# Altium footprint library 6-Connectors-4.PcbLib: 166 footprints (part 10 of 12)
Each footprint in its own frame and in the unit in brackets; x right, y up, seen from the top. Pads: shape width x height; smd on the part's side, far side on the other; paste and mask are expansions set on the pad; w line width, h text height; cw(c..) or ccw(c..) is an arc to the next point about the centre after c.
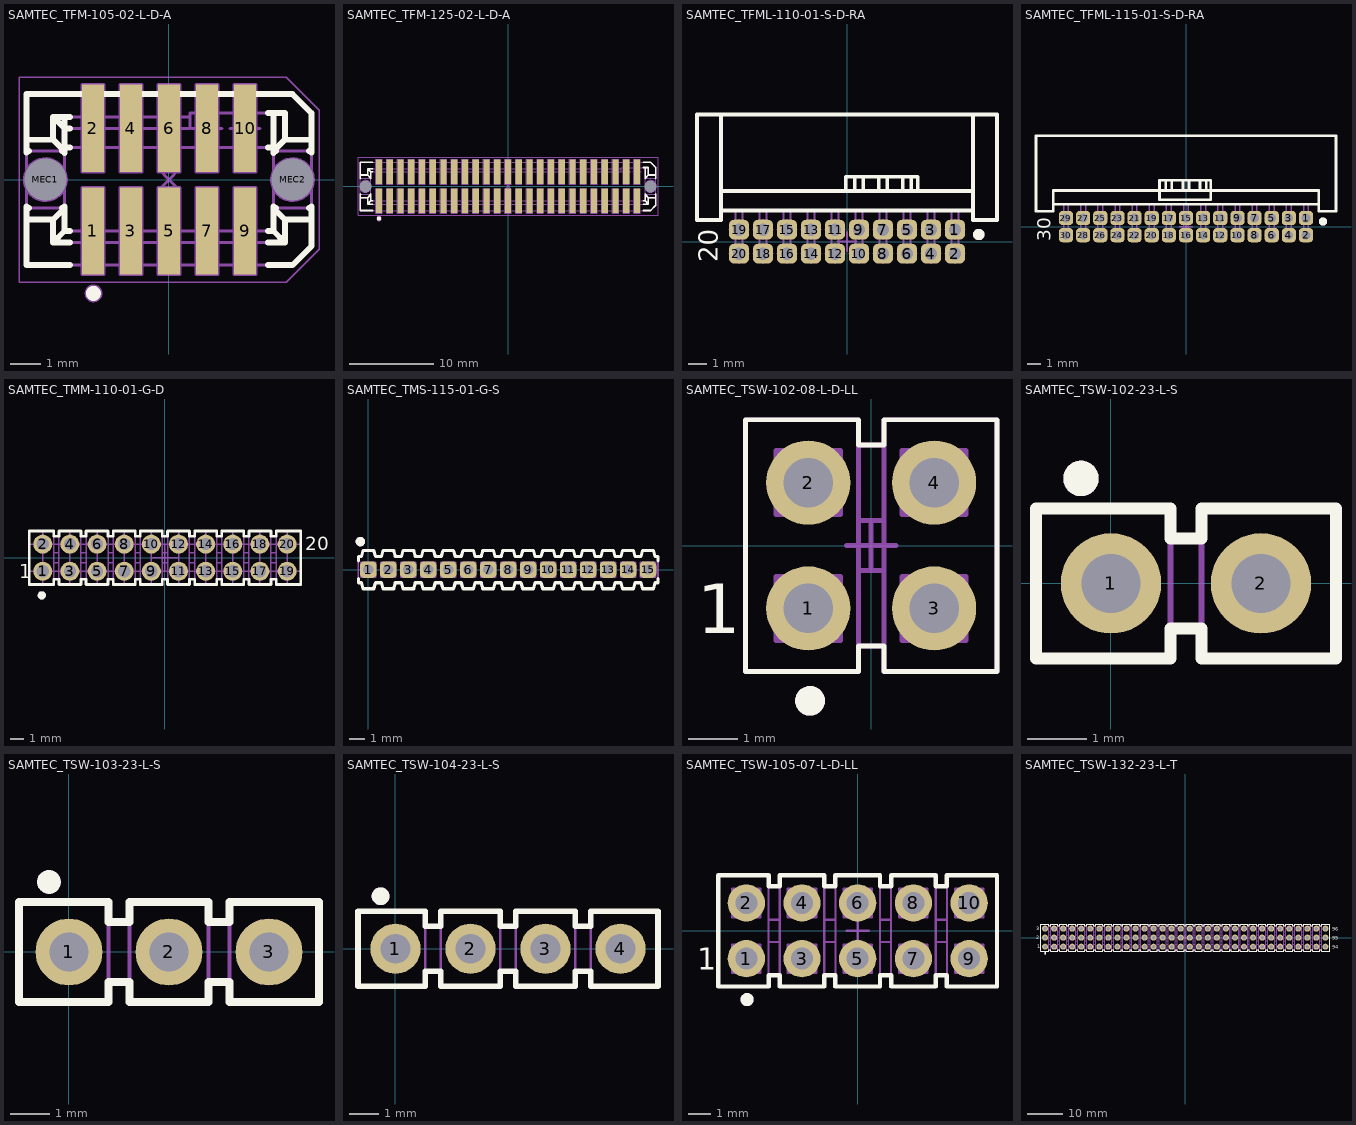
[diagram p9: the footprints below, top view; thin cyan lines are the x and y axes]

## SAMTEC_TFM-105-02-L-D-A [mm] "10 Contacts - Pitch 1.27mm - Dual Row Straight SMT Header"
height 5.72
pads (12):
  rect 0.74x2.92 smd: 1(-2.54,-1.715) 2(-2.54,1.715) 3(-1.27,-1.715) 4(-1.27,1.715) 5(0,-1.715) 6(0,1.715) 7(1.27,-1.715) 8(1.27,1.715) 9(2.54,-1.715) 10(2.54,1.715)
  round 1 hole 1.4 unplated mask+0.2: MEC1(-4.13,0) MEC2(4.13,0)
Top Overlay:
  circle w0.25: c-2.525,-3.8 r0.125
  circle w0.25: c-2.525,-3.8 r0.125
  lines w0.2: -4.762,-1.333 -3.873,-1.333 ; -4.762,-0.953 -4.68,-0.953 ; -4.762,-0.9 -4.762,-2.858 -3.31,-2.858 ; -4.762,0.9 -4.762,2.858 4.128,2.858 4.763,2.222 4.763,0.9 ; -4.762,0.953 -4.68,0.953 ; -4.762,1.333 -3.873,1.333 ; -3.58,-0.953 -3.492,-0.953 -3.873,-1.333 ; -3.58,0.953 -3.492,0.953 -3.873,1.333 ; -3.492,-0.896 -3.492,-1.714 ; -3.492,0.896 -3.492,2.095 ; -3.492,1.079 -3.31,1.079 ; -3.31,-2.095 -3.873,-2.095 ; -3.31,-1.714 -3.492,-1.714 ; -3.31,1.714 -3.492,1.714 -3.873,2.095 ; -3.31,2.095 -3.873,2.095 ; 3.31,-2.858 4.128,-2.858 4.763,-2.222 4.763,-0.9 ; 3.31,-2.095 3.874,-2.095 ; 3.31,-1.714 3.493,-1.714 ; 3.31,1.079 3.493,1.079 ; 3.31,2.222 3.874,2.222 3.874,1.333 ; 3.493,-0.896 3.493,-1.714 ; 3.493,0.896 3.493,2.222 ; 3.58,-0.953 3.493,-0.953 3.874,-1.333 ; 3.58,0.953 3.493,0.953 3.874,1.333 ; 4.68,-0.953 4.763,-0.953 ; 4.68,0.953 4.763,0.953 ; 4.763,-1.333 3.874,-1.333 ; 4.763,1.333 3.874,1.333 ; -3.873,-2.095 -3.492,-1.714 ; -3.873,-2.095 -3.873,-1.333 ; -3.873,1.333 -3.873,2.095 ; 3.493,-1.714 3.874,-2.095 ; 3.874,-2.095 3.874,-1.333
Mechanical 8:
  circle w0.1: c4.13,0 r0.7
  circle w0.1: c-4.13,0 r0.7
  lines w0.1: -4.63,0 -4.13,0 ; -4.13,-0.5 -4.13,0 ; -4.13,0.5 -4.13,0 ; -3.63,0 -4.13,0 ; -3.04,-1.715 -2.54,-1.715 ; -3.04,1.715 -2.54,1.715 ; -2.54,-2.215 -2.54,-1.715 ; -2.54,-1.215 -2.54,-1.715 ; -2.54,1.215 -2.54,1.715 ; -2.54,2.215 -2.54,1.715 ; -2.04,-1.715 -2.54,-1.715 ; -2.04,1.715 -2.54,1.715 ; -1.77,-1.715 -1.27,-1.715 ; -1.77,1.715 -1.27,1.715 ; -1.27,-2.215 -1.27,-1.715 ; -1.27,-1.215 -1.27,-1.715 ; -1.27,1.215 -1.27,1.715 ; -1.27,2.215 -1.27,1.715 ; -0.77,-1.715 -1.27,-1.715 ; -0.77,1.715 -1.27,1.715 ; -0.5,-1.715 0,-1.715 ; -0.5,1.715 0,1.715 ; -0.354,-0.354 0,0 ; -0.354,0.354 0,0 ; 0,-2.215 0,-1.715 ; 0,-1.215 0,-1.715 ; 0,1.215 0,1.715 ; 0,2.215 0,1.715 ; 0.354,-0.354 0,0 ; 0.354,0.354 0,0 ; 0.5,-1.715 0,-1.715 ; 0.5,1.715 0,1.715 ; 0.77,-1.715 1.27,-1.715 ; 0.77,1.715 1.27,1.715 ; 1.27,-2.215 1.27,-1.715 ; 1.27,-1.215 1.27,-1.715 ; 1.27,1.215 1.27,1.715 ; 1.27,2.215 1.27,1.715 ; 1.77,-1.715 1.27,-1.715 ; 1.77,1.715 1.27,1.715 ; 2.04,-1.715 2.54,-1.715 ; 2.04,1.715 2.54,1.715 ; 2.54,-2.215 2.54,-1.715 ; 2.54,-1.215 2.54,-1.715 ; 2.54,1.215 2.54,1.715 ; 2.54,2.215 2.54,1.715 ; 3.04,-1.715 2.54,-1.715 ; 3.04,1.715 2.54,1.715 ; 3.63,0 4.13,0 ; 4.13,-0.5 4.13,0 ; 4.13,0.5 4.13,0 ; 4.63,0 4.13,0 ; -2.91,-3.175 -2.91,-0.255 -2.17,-0.255 -2.17,-3.175 -2.91,-3.175 ; -2.91,0.255 -2.91,3.175 -2.17,3.175 -2.17,0.255 -2.91,0.255 ; -1.64,-3.175 -1.64,-0.255 -0.9,-0.255 -0.9,-3.175 -1.64,-3.175 ; -1.64,0.255 -1.64,3.175 -0.9,3.175 -0.9,0.255 -1.64,0.255 ; -0.37,-3.175 -0.37,-0.255 0.37,-0.255 0.37,-3.175 -0.37,-3.175 ; -0.37,0.255 -0.37,3.175 0.37,3.175 0.37,0.255 -0.37,0.255 ; 0.9,-3.175 0.9,-0.255 1.64,-0.255 1.64,-3.175 0.9,-3.175 ; 0.9,0.255 0.9,3.175 1.64,3.175 1.64,0.255 0.9,0.255 ; 2.17,-3.175 2.17,-0.255 2.91,-0.255 2.91,-3.175 2.17,-3.175 ; 2.17,0.255 2.17,3.175 2.91,3.175 2.91,0.255 2.17,0.255
Mechanical 14:
  circle w0.1: c-2.523,-3.8 r0.25
  lines w0.1: -4.762,-1.333 -3.873,-1.333 ; -4.762,-0.953 -3.492,-0.953 -3.873,-1.333 ; -4.762,0.953 -3.492,0.953 -3.873,1.333 ; -4.762,1.333 -3.873,1.333 ; -3.492,1.079 3.493,1.079 ; -3.492,2.095 -3.492,-1.714 ; 0.699,2.095 -3.873,2.095 ; 3.493,2.222 3.493,-1.714 ; 4.763,-1.333 3.874,-1.333 ; 4.763,-0.953 3.493,-0.953 3.874,-1.333 ; 4.763,0.953 3.493,0.953 3.874,1.333 ; 4.763,1.333 3.874,1.333 ; -3.873,-2.095 -3.492,-1.714 ; -3.873,-2.095 -3.873,-1.333 ; -3.873,-2.095 3.874,-2.095 ; -3.873,1.333 -3.873,2.095 ; -3.873,2.095 -3.492,1.714 0.699,1.714 0.699,2.222 3.874,2.222 3.874,1.333 ; -3.492,-1.714 3.493,-1.714 ; 3.493,-1.714 3.874,-2.095 ; 3.874,-2.095 3.874,-1.333 ; -4.762,-2.858 4.128,-2.858 4.763,-2.222 4.763,2.222 4.128,2.858 -4.762,2.858 -4.762,-2.858
Mechanical 15:
  lines w0.05: -5.012,-3.425 3.914,-3.425 5.013,-2.326 5.013,2.326 3.914,3.425 -5.012,3.425 -5.012,-3.425
3D body "p292-074.stp": height 0.02, standoff 0, extent -2.91,-3.175 -2.17,-0.255
3D body "p292-074.stp": height 0.02, standoff 0, extent -1.64,-3.175 -0.9,-0.255
3D body "p292-074.stp": height 0.02, standoff 0, extent -0.37,-3.175 0.37,-0.255
3D body "p292-074.stp": height 0.02, standoff 0, extent 0.9,-3.175 1.64,-0.255
3D body "p292-074.stp": height 0.02, standoff 0, extent 2.17,-3.175 2.91,-0.255
3D body "p292-074.stp": height 0.02, standoff 0, extent 2.17,0.255 2.91,3.175
3D body "p292-074.stp": height 0.02, standoff 0, extent 0.9,0.255 1.64,3.175
3D body "p292-074.stp": height 0.02, standoff 0, extent -0.37,0.255 0.37,3.175
3D body "p292-074.stp": height 0.02, standoff 0, extent -1.64,0.255 -0.9,3.175
3D body "p292-074.stp": height 0.02, standoff 0, extent -2.91,0.255 -2.17,3.175
3D body "SAMTEC_TFM?05?2–L–D–A.stp": height 5.59, standoff -1.14, extent -4.765,-2.984 4.765,2.985

## SAMTEC_TFM-125-02-L-D-A [mm] "50 Contacts - Pitch 1.27mm - Dual Row Straight SMT Header"
height 5.72
pads (52):
  rect 0.74x2.92 smd: 1(-15.24,-1.715) 2(-15.24,1.715) 3(-13.97,-1.715) 4(-13.97,1.715) 5(-12.7,-1.715) 6(-12.7,1.715) 7(-11.43,-1.715) 8(-11.43,1.715) 9(-10.16,-1.715) 10(-10.16,1.715) 11(-8.89,-1.715) 12(-8.89,1.715) 13(-7.62,-1.715) 14(-7.62,1.715) 15(-6.35,-1.715) 16(-6.35,1.715) 17(-5.08,-1.715) 18(-5.08,1.715) 19(-3.81,-1.715) 20(-3.81,1.715) 21(-2.54,-1.715) 22(-2.54,1.715) 23(-1.27,-1.715) 24(-1.27,1.715) 25(0,-1.715) 26(0,1.715) 27(1.27,-1.715) 28(1.27,1.715) 29(2.54,-1.715) 30(2.54,1.715) 31(3.81,-1.715) 32(3.81,1.715) 33(5.08,-1.715) 34(5.08,1.715) 35(6.35,-1.715) 36(6.35,1.715) 37(7.62,-1.715) 38(7.62,1.715) 39(8.89,-1.715) 40(8.89,1.715) 41(10.16,-1.715) 42(10.16,1.715) 43(11.43,-1.715) 44(11.43,1.715) 45(12.7,-1.715) 46(12.7,1.715) 47(13.97,-1.715) 48(13.97,1.715) 49(15.24,-1.715) 50(15.24,1.715)
  round 1 hole 1.4 unplated mask+0.2: MEC1(-16.83,0) MEC2(16.83,0)
Top Overlay:
  circle w0.25: c-15.225,-3.8 r0.125
  circle w0.25: c-15.225,-3.8 r0.125
  lines w0.2: -17.463,-1.333 -16.574,-1.333 ; -17.463,-0.953 -17.38,-0.953 ; -17.463,-0.9 -17.463,-2.858 -16.01,-2.858 ; -17.463,0.9 -17.463,2.858 -16.01,2.858 ; -17.463,0.953 -17.38,0.953 ; -17.463,1.333 -16.574,1.333 ; -16.28,-0.953 -16.193,-0.953 -16.574,-1.333 ; -16.28,0.953 -16.193,0.953 -16.574,1.333 ; -16.193,-0.896 -16.193,-1.714 ; -16.193,0.896 -16.193,1.714 ; -16.01,-2.095 -16.574,-2.095 ; -16.01,-1.714 -16.193,-1.714 ; -16.01,1.714 -16.193,1.714 ; -16.01,2.095 -16.574,2.095 ; 16.01,-2.858 16.828,-2.858 17.463,-2.222 17.463,-0.9 ; 16.01,-2.095 16.574,-2.095 ; 16.01,-1.714 16.193,-1.714 ; 16.01,2.222 16.574,2.222 16.574,1.333 ; 16.01,2.858 16.828,2.858 17.463,2.222 17.463,0.9 ; 16.193,-0.896 16.193,-1.714 ; 16.193,0.896 16.193,2.222 ; 16.28,-0.953 16.193,-0.953 16.574,-1.333 ; 16.28,0.953 16.193,0.953 16.574,1.333 ; 17.38,-0.953 17.463,-0.953 ; 17.38,0.953 17.463,0.953 ; 17.463,-1.333 16.574,-1.333 ; 17.463,1.333 16.574,1.333 ; -16.574,-2.095 -16.574,-1.333 ; -16.574,-2.095 -16.193,-1.714 ; -16.574,1.333 -16.574,2.095 ; -16.574,2.095 -16.193,1.714 ; 16.193,-1.714 16.574,-2.095 ; 16.574,-2.095 16.574,-1.333
Mechanical 8:
  drawing of 426 lines, arcs and shapes, not listed
Mechanical 14:
  circle w0.1: c-15.223,-3.8 r0.25
  lines w0.1: -17.463,-1.333 -16.574,-1.333 ; -17.463,-0.953 -16.193,-0.953 -16.574,-1.333 ; -17.463,0.953 -16.193,0.953 -16.574,1.333 ; -17.463,1.333 -16.574,1.333 ; 13.399,2.095 -16.574,2.095 ; 16.193,2.222 16.193,-1.714 ; 17.463,-1.333 16.574,-1.333 ; 17.463,-0.953 16.193,-0.953 16.574,-1.333 ; 17.463,0.953 16.193,0.953 16.574,1.333 ; 17.463,1.333 16.574,1.333 ; -16.574,-2.095 -16.574,-1.333 ; -16.574,-2.095 -16.193,-1.714 ; -16.574,-2.095 16.574,-2.095 ; -16.574,1.333 -16.574,2.095 ; -16.574,2.095 -16.193,1.714 ; -16.193,-1.714 16.193,-1.714 ; -16.193,-1.714 -16.193,1.714 ; -16.193,1.714 13.399,1.714 13.399,2.222 16.574,2.222 16.574,1.333 ; 16.193,-1.714 16.574,-2.095 ; 16.574,-2.095 16.574,-1.333 ; -17.463,-2.858 -17.463,2.858 16.828,2.858 17.463,2.222 17.463,-2.222 16.828,-2.858 -17.463,-2.858
Mechanical 15:
  lines w0.05: -17.713,-3.425 17.713,-3.425 17.713,3.425 -17.713,3.425 -17.713,-3.425
3D body "p292-074.stp": height 0.02, standoff 0, extent 14.87,0.255 15.61,3.175
3D body "p292-074.stp": height 0.02, standoff 0, extent 14.87,-3.175 15.61,-0.255
3D body "p292-074.stp": height 0.02, standoff 0, extent 13.6,0.255 14.34,3.175
3D body "p292-074.stp": height 0.02, standoff 0, extent 13.6,-3.175 14.34,-0.255
3D body "p292-074.stp": height 0.02, standoff 0, extent 12.33,0.255 13.07,3.175
3D body "p292-074.stp": height 0.02, standoff 0, extent 12.33,-3.175 13.07,-0.255
3D body "p292-074.stp": height 0.02, standoff 0, extent 11.06,-3.175 11.8,-0.255
3D body "p292-074.stp": height 0.02, standoff 0, extent 11.06,0.255 11.8,3.175
3D body "p292-074.stp": height 0.02, standoff 0, extent 9.79,0.255 10.53,3.175
3D body "p292-074.stp": height 0.02, standoff 0, extent 9.79,-3.175 10.53,-0.255
3D body "p292-074.stp": height 0.02, standoff 0, extent 8.52,-3.175 9.26,-0.255
3D body "p292-074.stp": height 0.02, standoff 0, extent 8.52,0.255 9.26,3.175
3D body "p292-074.stp": height 0.02, standoff 0, extent 7.25,0.255 7.99,3.175
3D body "p292-074.stp": height 0.02, standoff 0, extent 7.25,-3.175 7.99,-0.255
3D body "p292-074.stp": height 0.02, standoff 0, extent 5.98,-3.175 6.72,-0.255
3D body "p292-074.stp": height 0.02, standoff 0, extent 5.98,0.255 6.72,3.175
3D body "p292-074.stp": height 0.02, standoff 0, extent 4.71,0.255 5.45,3.175
3D body "p292-074.stp": height 0.02, standoff 0, extent 4.71,-3.175 5.45,-0.255
3D body "p292-074.stp": height 0.02, standoff 0, extent 2.17,0.255 2.91,3.175
3D body "p292-074.stp": height 0.02, standoff 0, extent 2.17,-3.175 2.91,-0.255
3D body "p292-074.stp": height 0.02, standoff 0, extent 0.9,0.255 1.64,3.175
3D body "p292-074.stp": height 0.02, standoff 0, extent 0.9,-3.175 1.64,-0.255
3D body "p292-074.stp": height 0.02, standoff 0, extent -0.37,0.255 0.37,3.175
3D body "p292-074.stp": height 0.02, standoff 0, extent -0.37,-3.175 0.37,-0.255
3D body "p292-074.stp": height 0.02, standoff 0, extent -1.64,-3.175 -0.9,-0.255
3D body "p292-074.stp": height 0.02, standoff 0, extent -1.64,0.255 -0.9,3.175
3D body "p292-074.stp": height 0.02, standoff 0, extent -2.91,0.255 -2.17,3.175
3D body "p292-074.stp": height 0.02, standoff 0, extent -2.91,-3.175 -2.17,-0.255
3D body "p292-074.stp": height 0.02, standoff 0, extent -2.91,0.255 -2.17,3.175
3D body "p292-074.stp": height 0.02, standoff 0, extent -2.91,-3.175 -2.17,-0.255
3D body "p292-074.stp": height 0.02, standoff 0, extent -4.18,-3.175 -3.44,-0.255
3D body "p292-074.stp": height 0.02, standoff 0, extent -4.18,0.255 -3.44,3.175
3D body "p292-074.stp": height 0.02, standoff 0, extent -5.45,0.255 -4.71,3.175
3D body "p292-074.stp": height 0.02, standoff 0, extent -5.45,-3.175 -4.71,-0.255
3D body "p292-074.stp": height 0.02, standoff 0, extent -6.72,0.255 -5.98,3.175
3D body "p292-074.stp": height 0.02, standoff 0, extent -6.72,-3.175 -5.98,-0.255
3D body "p292-074.stp": height 0.02, standoff 0, extent -7.99,-3.175 -7.25,-0.255
3D body "p292-074.stp": height 0.02, standoff 0, extent -7.99,0.255 -7.25,3.175
3D body "p292-074.stp": height 0.02, standoff 0, extent -9.26,-3.175 -8.52,-0.255
3D body "p292-074.stp": height 0.02, standoff 0, extent -9.26,0.255 -8.52,3.175
3D body "p292-074.stp": height 0.02, standoff 0, extent -10.53,0.255 -9.79,3.175
3D body "p292-074.stp": height 0.02, standoff 0, extent -10.53,-3.175 -9.79,-0.255
3D body "p292-074.stp": height 0.02, standoff 0, extent -11.8,-3.175 -11.06,-0.255
3D body "p292-074.stp": height 0.02, standoff 0, extent -11.8,0.255 -11.06,3.175
3D body "p292-074.stp": height 0.02, standoff 0, extent -13.07,0.255 -12.33,3.175
3D body "p292-074.stp": height 0.02, standoff 0, extent -13.07,-3.175 -12.33,-0.255
3D body "p292-074.stp": height 0.02, standoff 0, extent -14.34,-3.175 -13.6,-0.255
3D body "p292-074.stp": height 0.02, standoff 0, extent -14.34,0.255 -13.6,3.175
3D body "p292-074.stp": height 0.02, standoff 0, extent -15.61,0.255 -14.87,3.175
3D body "p292-074.stp": height 0.02, standoff 0, extent -15.61,-3.175 -14.87,-0.255
3D body "SAMTEC_TFM-125-02-L-D-A.stp": height 5.59, standoff -1.14, extent -17.465,-2.984 17.465,2.985

## SAMTEC_TFML-110-01-S-D-RA [mm] "20 Contacts - Pitch 1.27mm - Dual Row Right Angle Through-Hole Header"
height 5.72
pads (20):
  rrect50% 1.05x1.05 hole 0.65: 1(5.715,0.635) 2(5.715,-0.635) 3(4.445,0.635) 4(4.445,-0.635) 5(3.175,0.635) 6(3.175,-0.635) 7(1.905,0.635) 8(1.905,-0.635) 9(0.635,0.635) 10(0.635,-0.635) 11(-0.635,0.635) 12(-0.635,-0.635) 13(-1.905,0.635) 14(-1.905,-0.635) 15(-3.175,0.635) 16(-3.175,-0.635) 17(-4.445,0.635) 18(-4.445,-0.635) 19(-5.715,0.635) 20(-5.715,-0.635)
Top Overlay:
  circle w0.3: c6.975,0.375 r0.15
  lines w0.2: -6.668,1.651 6.668,1.651 ; -6.668,2.678 6.668,2.678 ; -6.668,6.731 -6.668,1.143 -7.938,1.143 -7.938,6.731 7.938,6.731 7.938,1.143 6.668,1.143 6.668,6.731 ; -0.064,2.678 -0.064,3.429 3.747,3.429 3.747,2.678 ; 0.406,2.678 0.406,3.429 ; 0.864,2.678 0.864,3.429 ; 1.676,2.678 1.676,3.429 ; 2.134,2.678 2.134,3.429 ; 2.946,2.678 2.946,3.429 ; 3.404,2.678 3.404,3.429
  text "20" at -6.847,-1.097 h1
Mechanical 8:
  lines w0.1: -6.215,-0.635 -5.715,-0.635 ; -6.215,0.635 -5.715,0.635 ; -5.715,-1.135 -5.715,-0.635 ; -5.715,-0.135 -5.715,-0.635 ; -5.715,0.135 -5.715,0.635 ; -5.715,1.135 -5.715,0.635 ; -5.215,-0.635 -5.715,-0.635 ; -5.215,0.635 -5.715,0.635 ; -4.945,-0.635 -4.445,-0.635 ; -4.945,0.635 -4.445,0.635 ; -4.445,-1.135 -4.445,-0.635 ; -4.445,-0.135 -4.445,-0.635 ; -4.445,0.135 -4.445,0.635 ; -4.445,1.135 -4.445,0.635 ; -3.945,-0.635 -4.445,-0.635 ; -3.945,0.635 -4.445,0.635 ; -3.675,-0.635 -3.175,-0.635 ; -3.675,0.635 -3.175,0.635 ; -3.175,-1.135 -3.175,-0.635 ; -3.175,-0.135 -3.175,-0.635 ; -3.175,0.135 -3.175,0.635 ; -3.175,1.135 -3.175,0.635 ; -2.675,-0.635 -3.175,-0.635 ; -2.675,0.635 -3.175,0.635 ; -2.405,-0.635 -1.905,-0.635 ; -2.405,0.635 -1.905,0.635 ; -1.905,-1.135 -1.905,-0.635 ; -1.905,-0.135 -1.905,-0.635 ; -1.905,0.135 -1.905,0.635 ; -1.905,1.135 -1.905,0.635 ; -1.405,-0.635 -1.905,-0.635 ; -1.405,0.635 -1.905,0.635 ; -1.135,-0.635 -0.635,-0.635 ; -1.135,0.635 -0.635,0.635 ; -0.635,-1.135 -0.635,-0.635 ; -0.635,-0.135 -0.635,-0.635 ; -0.635,0.135 -0.635,0.635 ; -0.635,1.135 -0.635,0.635 ; -0.5,0 0,0 ; -0.135,-0.635 -0.635,-0.635 ; -0.135,0.635 -0.635,0.635 ; 0,-0.5 0,0 ; 0,0.5 0,0 ; 0.135,-0.635 0.635,-0.635 ; 0.135,0.635 0.635,0.635 ; 0.5,0 0,0 ; 0.635,-1.135 0.635,-0.635 ; 0.635,-0.135 0.635,-0.635 ; 0.635,0.135 0.635,0.635 ; 0.635,1.135 0.635,0.635 ; 1.135,-0.635 0.635,-0.635 ; 1.135,0.635 0.635,0.635 ; 1.405,-0.635 1.905,-0.635 ; 1.405,0.635 1.905,0.635 ; 1.905,-1.135 1.905,-0.635 ; 1.905,-0.135 1.905,-0.635 ; 1.905,0.135 1.905,0.635 ; 1.905,1.135 1.905,0.635 ; 2.405,-0.635 1.905,-0.635 ; 2.405,0.635 1.905,0.635 ; 2.675,-0.635 3.175,-0.635 ; 2.675,0.635 3.175,0.635 ; 3.175,-1.135 3.175,-0.635 ; 3.175,-0.135 3.175,-0.635 ; 3.175,0.135 3.175,0.635 ; 3.175,1.135 3.175,0.635 ; 3.675,-0.635 3.175,-0.635 ; 3.675,0.635 3.175,0.635 ; 3.945,-0.635 4.445,-0.635 ; 3.945,0.635 4.445,0.635 ; 4.445,-1.135 4.445,-0.635 ; 4.445,-0.135 4.445,-0.635 ; 4.445,0.135 4.445,0.635 ; 4.445,1.135 4.445,0.635 ; 4.945,-0.635 4.445,-0.635 ; 4.945,0.635 4.445,0.635 ; 5.215,-0.635 5.715,-0.635 ; 5.215,0.635 5.715,0.635 ; 5.715,-1.135 5.715,-0.635 ; 5.715,-0.135 5.715,-0.635 ; 5.715,0.135 5.715,0.635 ; 5.715,1.135 5.715,0.635 ; 6.215,-0.635 5.715,-0.635 ; 6.215,0.635 5.715,0.635
Mechanical 14:
  circle w0.3: c6.975,0.375 r0.15
  lines w0.1: -6.668,1.651 6.668,1.651 ; -6.668,2.678 6.668,2.678 ; -6.668,6.731 -6.668,1.143 -7.938,1.143 -7.938,6.731 7.938,6.731 7.938,1.143 6.668,1.143 6.668,6.731 ; -5.893,1.651 -5.893,-0.762 -5.537,-0.762 -5.537,1.651 ; -4.623,1.651 -4.623,-0.762 -4.267,-0.762 -4.267,1.651 ; -3.353,1.651 -3.353,-0.762 -2.997,-0.762 -2.997,1.651 ; -2.083,1.651 -2.083,-0.762 -1.727,-0.762 -1.727,1.651 ; -0.813,1.651 -0.813,-0.762 -0.457,-0.762 -0.457,1.651 ; -0.064,2.678 -0.064,3.429 3.747,3.429 3.747,2.678 ; 0.406,2.678 0.406,3.429 ; 0.457,1.651 0.457,-0.762 0.813,-0.762 0.813,1.651 ; 0.864,2.678 0.864,3.429 ; 1.676,2.678 1.676,3.429 ; 1.727,1.651 1.727,-0.762 2.083,-0.762 2.083,1.651 ; 2.134,2.678 2.134,3.429 ; 2.946,2.678 2.946,3.429 ; 2.997,1.651 2.997,-0.762 3.353,-0.762 3.353,1.651 ; 3.404,2.678 3.404,3.429 ; 4.267,1.651 4.267,-0.762 4.623,-0.762 4.623,1.651 ; 5.537,1.651 5.537,-0.762 5.893,-0.762 5.893,1.651
  text "20" at -6.847,-1.097 h1
3D body "SAMTEC_TFML-110-01-S-D-RA.stp": height 5.71, standoff -1.91, extent -7.937,-0.762 7.938,6.731
3D body "v105-065.stp": height 0.02, standoff -1.65, extent -6.24,0.11 -5.19,1.16
3D body "v105-065.stp": height 0.02, standoff -1.65, extent -6.24,-1.16 -5.19,-0.11
3D body "v105-065.stp": height 0.02, standoff -1.65, extent -4.97,0.11 -3.92,1.16
3D body "v105-065.stp": height 0.02, standoff -1.65, extent -4.97,-1.16 -3.92,-0.11
3D body "v105-065.stp": height 0.02, standoff -1.65, extent -3.7,0.11 -2.65,1.16
3D body "v105-065.stp": height 0.02, standoff -1.65, extent -3.7,-1.16 -2.65,-0.11
3D body "v105-065.stp": height 0.02, standoff -1.65, extent -2.43,0.11 -1.38,1.16
3D body "v105-065.stp": height 0.02, standoff -1.65, extent -2.43,-1.16 -1.38,-0.11
3D body "v105-065.stp": height 0.02, standoff -1.65, extent -1.16,0.11 -0.11,1.16
3D body "v105-065.stp": height 0.02, standoff -1.65, extent -1.16,-1.16 -0.11,-0.11
3D body "v105-065.stp": height 0.02, standoff -1.65, extent 0.11,0.11 1.16,1.16
3D body "v105-065.stp": height 0.02, standoff -1.65, extent 0.11,-1.16 1.16,-0.11
3D body "v105-065.stp": height 0.02, standoff -1.65, extent 1.38,0.11 2.43,1.16
3D body "v105-065.stp": height 0.02, standoff -1.65, extent 1.38,-1.16 2.43,-0.11
3D body "v105-065.stp": height 0.02, standoff -1.65, extent 2.65,0.11 3.7,1.16
3D body "v105-065.stp": height 0.02, standoff -1.65, extent 2.65,-1.16 3.7,-0.11
3D body "v105-065.stp": height 0.02, standoff -1.65, extent 3.92,0.11 4.97,1.16
3D body "v105-065.stp": height 0.02, standoff -1.65, extent 3.92,-1.16 4.97,-0.11
3D body "v105-065.stp": height 0.02, standoff -1.65, extent 5.19,0.11 6.24,1.16
3D body "v105-065.stp": height 0.02, standoff -1.65, extent 5.19,-1.16 6.24,-0.11

## SAMTEC_TFML-115-01-S-D-RA [mm] "30 Contacts - Pitch 1.27mm - Dual Row Right Angle Through-Hole Header"
height 5.72
pads (30):
  rrect50% 1.05x1.05 hole 0.65: 1(8.89,0.635) 2(8.89,-0.635) 3(7.62,0.635) 4(7.62,-0.635) 5(6.35,0.635) 6(6.35,-0.635) 7(5.08,0.635) 8(5.08,-0.635) 9(3.81,0.635) 10(3.81,-0.635) 11(2.54,0.635) 12(2.54,-0.635) 13(1.27,0.635) 14(1.27,-0.635) 15(0,0.635) 16(0,-0.635) 17(-1.27,0.635) 18(-1.27,-0.635) 19(-2.54,0.635) 20(-2.54,-0.635) 21(-3.81,0.635) 22(-3.81,-0.635) 23(-5.08,0.635) 24(-5.08,-0.635) 25(-6.35,0.635) 26(-6.35,-0.635) 27(-7.62,0.635) 28(-7.62,-0.635) 29(-8.89,0.635) 30(-8.89,-0.635)
Top Overlay:
  circle w0.3: c10.15,0.375 r0.15
  lines w0.2: -9.843,1.651 9.843,1.651 ; -1.499,2.678 -1.499,3.429 ; -1.046,2.678 -1.046,3.429 ; -0.229,2.678 -0.229,3.429 ; 0.229,2.678 0.229,3.429 ; 1.041,2.678 1.041,3.429 ; 1.499,2.678 1.499,3.429 ; -11.113,1.143 -9.843,1.143 -9.843,2.678 9.843,2.678 9.843,1.143 11.113,1.143 11.113,6.731 -11.113,6.731 -11.113,1.143 ; -1.968,1.981 -1.968,3.429 1.841,3.429 1.841,1.981 -1.968,1.981
  text "30" at -10.022,-1.097 h1
Mechanical 8:
  lines w0.1: -9.39,-0.635 -8.89,-0.635 ; -9.39,0.635 -8.89,0.635 ; -8.89,-1.135 -8.89,-0.635 ; -8.89,-0.135 -8.89,-0.635 ; -8.89,0.135 -8.89,0.635 ; -8.89,1.135 -8.89,0.635 ; -8.39,-0.635 -8.89,-0.635 ; -8.39,0.635 -8.89,0.635 ; -8.12,-0.635 -7.62,-0.635 ; -8.12,0.635 -7.62,0.635 ; -7.62,-1.135 -7.62,-0.635 ; -7.62,-0.135 -7.62,-0.635 ; -7.62,0.135 -7.62,0.635 ; -7.62,1.135 -7.62,0.635 ; -7.12,-0.635 -7.62,-0.635 ; -7.12,0.635 -7.62,0.635 ; -6.85,-0.635 -6.35,-0.635 ; -6.85,0.635 -6.35,0.635 ; -6.35,-1.135 -6.35,-0.635 ; -6.35,-0.135 -6.35,-0.635 ; -6.35,0.135 -6.35,0.635 ; -6.35,1.135 -6.35,0.635 ; -5.85,-0.635 -6.35,-0.635 ; -5.85,0.635 -6.35,0.635 ; -5.58,-0.635 -5.08,-0.635 ; -5.58,0.635 -5.08,0.635 ; -5.08,-1.135 -5.08,-0.635 ; -5.08,-0.135 -5.08,-0.635 ; -5.08,0.135 -5.08,0.635 ; -5.08,1.135 -5.08,0.635 ; -4.58,-0.635 -5.08,-0.635 ; -4.58,0.635 -5.08,0.635 ; -4.31,-0.635 -3.81,-0.635 ; -4.31,0.635 -3.81,0.635 ; -3.81,-1.135 -3.81,-0.635 ; -3.81,-0.135 -3.81,-0.635 ; -3.81,0.135 -3.81,0.635 ; -3.81,1.135 -3.81,0.635 ; -3.31,-0.635 -3.81,-0.635 ; -3.31,0.635 -3.81,0.635 ; -3.04,-0.635 -2.54,-0.635 ; -3.04,0.635 -2.54,0.635 ; -2.54,-1.135 -2.54,-0.635 ; -2.54,-0.135 -2.54,-0.635 ; -2.54,0.135 -2.54,0.635 ; -2.54,1.135 -2.54,0.635 ; -2.04,-0.635 -2.54,-0.635 ; -2.04,0.635 -2.54,0.635 ; -1.77,-0.635 -1.27,-0.635 ; -1.77,0.635 -1.27,0.635 ; -1.27,-1.135 -1.27,-0.635 ; -1.27,-0.135 -1.27,-0.635 ; -1.27,0.135 -1.27,0.635 ; -1.27,1.135 -1.27,0.635 ; -0.77,-0.635 -1.27,-0.635 ; -0.77,0.635 -1.27,0.635 ; -0.5,-0.635 0,-0.635 ; -0.5,0 0,0 ; -0.5,0.635 0,0.635 ; 0,-1.135 0,-0.635 ; 0,-0.5 0,0 ; 0,-0.135 0,-0.635 ; 0,0.135 0,0.635 ; 0,0.5 0,0 ; 0,1.135 0,0.635 ; 0.5,-0.635 0,-0.635 ; 0.5,0 0,0 ; 0.5,0.635 0,0.635 ; 0.77,-0.635 1.27,-0.635 ; 0.77,0.635 1.27,0.635 ; 1.27,-1.135 1.27,-0.635 ; 1.27,-0.135 1.27,-0.635 ; 1.27,0.135 1.27,0.635 ; 1.27,1.135 1.27,0.635 ; 1.77,-0.635 1.27,-0.635 ; 1.77,0.635 1.27,0.635 ; 2.04,-0.635 2.54,-0.635 ; 2.04,0.635 2.54,0.635 ; 2.54,-1.135 2.54,-0.635 ; 2.54,-0.135 2.54,-0.635 ; 2.54,0.135 2.54,0.635 ; 2.54,1.135 2.54,0.635 ; 3.04,-0.635 2.54,-0.635 ; 3.04,0.635 2.54,0.635 ; 3.31,-0.635 3.81,-0.635 ; 3.31,0.635 3.81,0.635 ; 3.81,-1.135 3.81,-0.635 ; 3.81,-0.135 3.81,-0.635 ; 3.81,0.135 3.81,0.635 ; 3.81,1.135 3.81,0.635 ; 4.31,-0.635 3.81,-0.635 ; 4.31,0.635 3.81,0.635 ; 4.58,-0.635 5.08,-0.635 ; 4.58,0.635 5.08,0.635 ; 5.08,-1.135 5.08,-0.635 ; 5.08,-0.135 5.08,-0.635 ; 5.08,0.135 5.08,0.635 ; 5.08,1.135 5.08,0.635 ; 5.58,-0.635 5.08,-0.635 ; 5.58,0.635 5.08,0.635 ; 5.85,-0.635 6.35,-0.635 ; 5.85,0.635 6.35,0.635 ; 6.35,-1.135 6.35,-0.635 ; 6.35,-0.135 6.35,-0.635 ; 6.35,0.135 6.35,0.635 ; 6.35,1.135 6.35,0.635 ; 6.85,-0.635 6.35,-0.635 ; 6.85,0.635 6.35,0.635 ; 7.12,-0.635 7.62,-0.635 ; 7.12,0.635 7.62,0.635 ; 7.62,-1.135 7.62,-0.635 ; 7.62,-0.135 7.62,-0.635 ; 7.62,0.135 7.62,0.635 ; 7.62,1.135 7.62,0.635 ; 8.12,-0.635 7.62,-0.635 ; 8.12,0.635 7.62,0.635 ; 8.39,-0.635 8.89,-0.635 ; 8.39,0.635 8.89,0.635 ; 8.89,-1.135 8.89,-0.635 ; 8.89,-0.135 8.89,-0.635 ; 8.89,0.135 8.89,0.635 ; 8.89,1.135 8.89,0.635 ; 9.39,-0.635 8.89,-0.635 ; 9.39,0.635 8.89,0.635